# Altium footprint library RPSLib_Connectors.PcbLib: 85 footprints (part 5 of 6)
Each footprint in its own frame and in the unit in brackets; x right, y up, seen from the top. Pads: shape width x height; smd on the part's side, far side on the other; paste and mask are expansions set on the pad; w line width, h text height; cw(c..) or ccw(c..) is an arc to the next point about the centre after c.
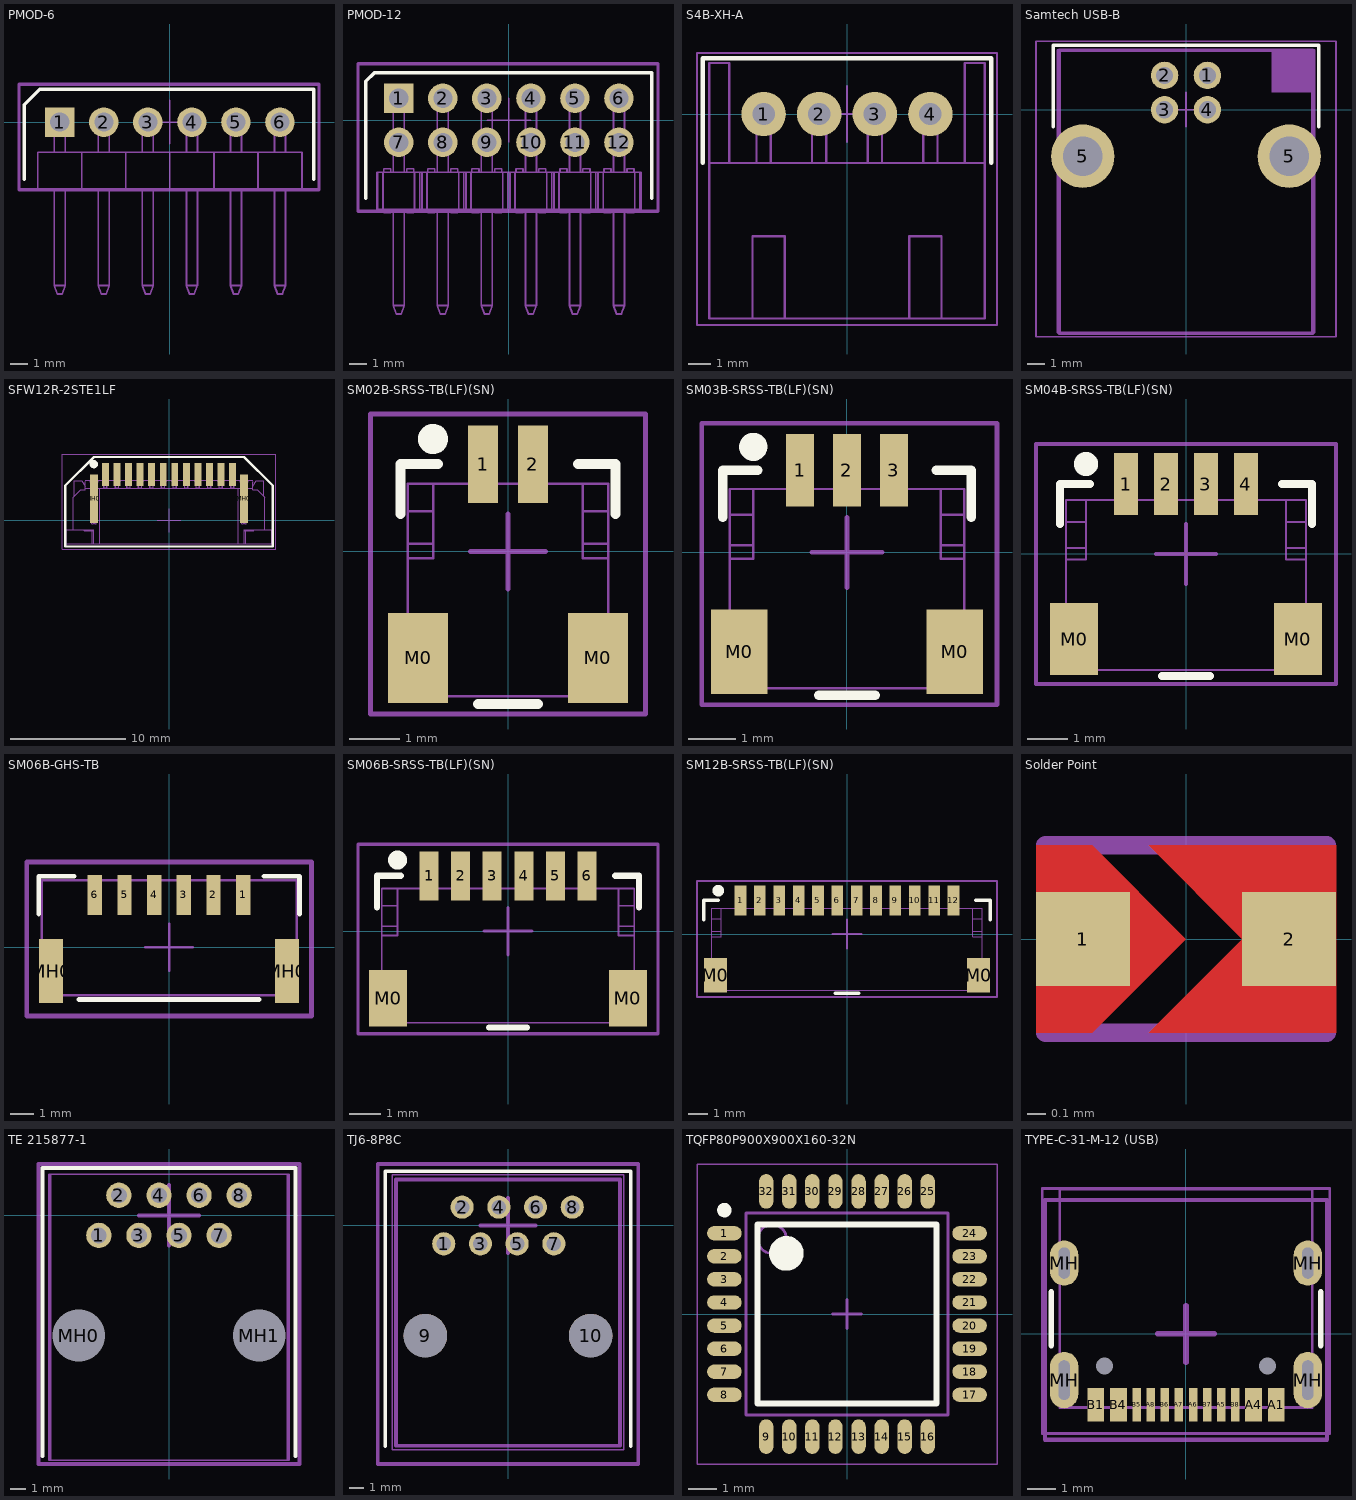
[diagram p4: the footprints below, top view; thin cyan lines are the x and y axes]

## PMOD-6 [mm] "Digilent PMOD connector 6 pin"
height 2.5
pads (6):
  rect 1.7x1.7 hole 1.1 mask+0.07: 1(-6.35,0)
  round 1.7 hole 1.1 mask+0.07: 2(-3.81,0) 3(-1.27,0) 4(1.27,0) 5(3.81,0) 6(6.35,0)
Top Overlay:
  lines w0.2: -8.4,-3.3 -8.4,1 -7.5,1.9 8.3,1.9 8.3,-3.3
Top Designator:
  text ".Designator" at -2.868,-0.271 h1.2
Top Courtyard:
  lines w0.1: -1.25,0 1.25,0 ; 0,-1.25 0,1.25
  lines w0.2: -8.7,-3.9 8.6,-3.9 8.6,2.2 -8.7,2.2 -8.7,-3.9
Top 3D Body:
  lines w0.1: -6.667,-3.861 -6.667,-9.417 ; -6.667,-1.727 -6.667,-0.953 -6.667,0.318 -6.032,0.318 -6.032,-0.953 -6.032,-1.727 ; -6.032,-3.861 -6.032,-9.417 ; -4.127,-3.861 -4.127,-9.417 ; -4.127,-1.727 -4.127,-0.953 -4.127,0.318 -3.492,0.318 -3.492,-0.953 -3.492,-1.727 ; -3.492,-3.861 -3.492,-9.417 ; -1.587,-3.861 -1.587,-9.417 ; -1.587,-1.727 -1.587,-0.953 -1.587,0.318 -0.953,0.318 -0.953,-0.953 -0.953,-1.727 ; -0.953,-3.861 -0.953,-9.417 ; 0.953,-3.861 0.953,-9.417 ; 0.953,-1.727 0.953,-0.953 0.953,0.318 1.587,0.318 1.587,-0.953 1.587,-1.727 ; 1.587,-3.861 1.587,-9.417 ; 3.492,-3.861 3.492,-9.417 ; 3.492,-1.727 3.492,-0.953 3.492,0.318 4.127,0.318 4.127,-0.953 4.127,-1.727 ; 4.127,-3.861 4.127,-9.417 ; 6.032,-3.861 6.032,-9.417 ; 6.032,-1.727 6.032,-0.953 6.032,0.318 6.667,0.318 6.667,-0.953 6.667,-1.727 ; 6.667,-3.861 6.667,-9.417 ; -6.667,-9.417 -6.032,-9.417 ; -6.667,-9.417 -6.49,-9.906 -6.21,-9.906 -6.032,-9.417 ; -5.08,-3.861 -5.08,-1.727 ; -5.08,-3.861 -4.775,-3.861 -2.845,-3.861 -2.54,-3.861 ; -5.08,-3.861 -5.385,-3.861 -7.315,-3.861 -7.62,-3.861 -7.62,-1.727 -7.315,-1.727 -5.385,-1.727 -5.08,-1.727 ; -5.08,-1.727 -4.775,-1.727 -2.845,-1.727 -2.54,-1.727 ; -4.127,-9.417 -3.95,-9.906 -3.67,-9.906 -3.492,-9.417 ; -4.127,-9.417 -3.492,-9.417 ; -2.54,-3.861 -2.54,-1.727 ; -2.54,-3.861 -2.235,-3.861 -0.305,-3.861 0,-3.861 ; -2.54,-1.727 -2.235,-1.727 -0.305,-1.727 0,-1.727 ; -1.587,-9.417 -0.953,-9.417 ; -1.587,-9.417 -1.41,-9.906 -1.13,-9.906 -0.953,-9.417 ; 0,-3.861 0,-1.727 ; 0,-3.861 0.305,-3.861 2.235,-3.861 2.54,-3.861 ; 0,-1.727 0.305,-1.727 2.235,-1.727 2.54,-1.727 ; 0.953,-9.417 1.587,-9.417 ; 0.953,-9.417 1.13,-9.906 1.41,-9.906 1.587,-9.417 ; 2.54,-3.861 2.54,-1.727 ; 2.54,-3.861 2.845,-3.861 4.775,-3.861 5.08,-3.861 ; 2.54,-1.727 2.845,-1.727 4.775,-1.727 5.08,-1.727 ; 3.492,-9.417 4.127,-9.417 ; 3.492,-9.417 3.67,-9.906 3.95,-9.906 4.127,-9.417 ; 5.08,-3.861 5.08,-1.727 ; 5.08,-3.861 5.385,-3.861 7.315,-3.861 7.62,-3.861 7.62,-1.727 7.315,-1.727 5.385,-1.727 5.08,-1.727 ; 6.032,-9.417 6.21,-9.906 6.49,-9.906 6.667,-9.417 ; 6.032,-9.417 6.667,-9.417
3D body "PMOD-6pin.stp": height 2.41, standoff -2.98, extent -7.62,-9.906 7.62,0.318

## PMOD-12 [mm] "Digilent PMOD connector 12 pin"
height 4.9
pads (12):
  rect 1.7x1.7 hole 1.1 mask+0.07: 1(-6.35,1.27)
  round 1.7 hole 1.1 mask+0.07: 2(-3.81,1.27) 3(-1.27,1.27) 4(1.27,1.27) 5(3.81,1.27) 6(6.35,1.27) 7(-6.35,-1.27) 8(-3.81,-1.27) 9(-1.27,-1.27) 10(1.27,-1.27) 11(3.81,-1.27) 12(6.35,-1.27)
Top Overlay:
  lines w0.2: -8.25,-4.5 -8.25,2.25 -7.75,2.75 8.25,2.75 8.25,-4.5
Top Designator:
  text ".Designator" at -2.868,-0.271 h1.2
Top Courtyard:
  lines w0.1: -1.25,0 1.25,0 ; 0,-1.25 0,1.25
  lines w0.2: -8.7,-5.25 8.6,-5.25 8.6,3.25 -8.7,3.25 -8.7,-5.25
Top 3D Body:
  drawing of 256 lines, arcs and shapes, not listed
3D body "PMOD-12pin.stp": height 4.83, standoff -3.06, extent -7.62,-11.176 7.62,1.588

## S4B-XH-A [mm]
pads (4):
  round 2 hole 1 mask+0.07: 1(-3.75,0) 2(-1.25,0) 3(1.25,0) 4(3.75,0)
Top Overlay:
  lines w0.2: -6.5,-2.2 -6.5,2.5 6.5,2.5 6.5,-2.2
Top Designator:
  text ".Designator" at -2.868,-0.271 h1.2
Top Courtyard:
  lines w0.1: -1.25,0 1.25,0 ; 0,-1.25 0,1.25 ; -6.75,-9.5 -6.75,2.75 6.75,2.75 6.75,-9.5 -6.75,-9.5
Top 3D Body:
  lines w0.1: -5.3,-2.2 -5.3,2.3 -6.2,2.3 -6.2,-2.2 ; -4.07,-2.2 -4.07,-0.92 -4.07,0.32 -3.43,0.32 -3.43,-0.92 -3.43,-2.2 ; -1.57,-2.2 -1.57,-0.92 -1.57,0.32 -0.93,0.32 -0.93,-0.92 -0.93,-2.2 ; 0.93,-2.2 0.93,-0.92 0.93,0.32 1.57,0.32 1.57,-0.92 1.57,-2.2 ; 3.43,-2.2 3.43,-0.92 3.43,0.32 4.07,0.32 4.07,-0.92 4.07,-2.2 ; 5.3,-2.2 5.3,2.3 6.2,2.3 6.2,-2.2 ; -6.2,-2.2 6.2,-2.2 ; -6.2,-2.2 -6.2,-9.2 -4.25,-9.2 ; -4.25,-9.2 -2.8,-9.2 ; -4.25,-9.2 -4.25,-5.5 -2.8,-5.5 -2.8,-9.2 ; -2.8,-9.2 2.8,-9.2 ; 2.8,-9.2 4.25,-9.2 ; 2.8,-9.2 2.8,-5.5 4.25,-5.5 4.25,-9.2 ; 4.25,-9.2 6.2,-9.2 6.2,-2.2
3D body "S4B-XH-A_norm.stp": height 6.15, standoff -3.4, extent -6.2,-9.2 6.2,2.3

## Samtech USB-B [mm]
pads (6):
  round 1.6 hole 1: 1(1.25,2) 2(-1.25,2) 3(-1.25,0) 4(1.25,0)
  round 3.7 hole 2.3: 5(-6.02,-2.71) 5(6.02,-2.71)
Top Overlay:
  lines w0.2: -7.75,-1 -7.75,3.75 7.75,3.75 7.75,-1
Top Designator:
  rectangle: 5,1 7.5,3.5
  lines w0.1: -7.5,-13 -7.5,3.5 7.5,3.5 7.5,-13 -7.5,-13
  text ".Designator" at -2.868,-0.271 h1.2
Top Courtyard:
  lines w0.1: -1,0 1,0 ; 0,-1 0,1 ; -8.75,-13.25 -8.75,4 8.75,4 8.75,-13.25 -8.75,-13.25
Top 3D Body:
  lines w0.2: -7.4,-13.03 -7.4,3.47 7.398,3.47 7.398,-13.03 -7.4,-13.03
20:
  text ".Designator" at -1.126,-0.113 h0.5
3D body "USB-B.stp": height 11.2, standoff -3.44, extent -7.4,-13.03 7.398,3.47

## SFW12R-2STE1LF [mm]
height 2.7
pads (14):
  rect 0.6x2 smd mask+0.07: 1(-5.5,4) 2(-4.5,4) 3(-3.5,4) 4(-2.5,4) 5(-1.5,4) 6(-0.5,4) 7(0.5,4) 8(1.5,4) 9(2.5,4) 10(3.5,4) 11(4.5,4) 12(5.5,4)
  rect 0.7x4.2 smd mask+0.07: MH0(-6.5,1.9) MH0(6.5,1.9)
Top Overlay:
  circle w0.35: c-6.518,4.88 r0.18
  lines w0.2: -9,-2.25 9,-2.25 9,3 6.5,5.5 -6.5,5.5 -9,3 -9,-2.25
Top Designator:
  text ".Designator" at -2.868,-0.271 h1.2
Top Courtyard:
  lines w0.1: -1,0 1,0 ; 0,-1 0,1 ; -9.25,-2.5 -9.25,5.75 9.25,5.75 9.25,-2.5 -9.25,-2.5
Top 3D Body:
  drawing of 1279 lines, arcs and shapes, not listed
3D body "SFW12R-2STE1LF_norm.stp": height 2.7, standoff 0, extent -8.9,-2 8.9,4.5

## SM02B-SRSS-TB(LF)(SN) [mm] "JST 1.0 mm pitch connector"
height 3
pads (4):
  rect 0.6x1.55 smd mask+0.07: 1(-0.5,1.75) 2(0.5,1.75)
  rect 1.2x1.8 smd mask+0.07: M0(-1.8,-2.125) M0(1.8,-2.125)
Top Overlay:
  circle w0.4: c-1.5,2.25 r0.1
  lines w0.2: -2.15,0.75 -2.15,1.75 -1.4,1.75 ; -0.6,-3.05 0.6,-3.05 ; 1.4,1.75 2.15,1.75 2.15,0.75
Top Designator:
  text ".Designator" at -2.868,-0.271 h1.2
Top Courtyard:
  lines w0.1: -0.75,0 0.75,0 ; 0,-0.75 0,0.75 ; -2.75,-3.25 -2.75,2.75 2.75,2.75 2.75,-3.25 -2.75,-3.25
Top 3D Body:
  lines w0.05: -1.5,0.15 -2,0.15 ; -1.5,0.8 -2,0.8 ; -0.6,1.35 -0.6,2.05 -0.4,2.05 -0.4,1.35 ; 0.4,1.35 0.4,2.05 0.6,2.05 0.6,1.35 ; 1.5,0.15 2,0.15 ; 1.5,0.8 2,0.8 ; -2,-0.139 -1.5,-0.139 -1.5,1.35 ; -2,-0.139 -2,0.15 ; -2,-0.139 -2,-2.9 2,-2.9 2,-0.139 ; -2,0.15 -2,0.8 ; -2,0.8 -2,1.35 -1.5,1.35 ; -1.5,1.35 1.5,1.35 ; 1.5,1.35 2,1.35 2,0.8 ; 1.5,1.35 1.5,-0.139 2,-0.139 ; 2,-0.139 2,0.15 ; 2,0.15 2,0.8
3D body "SM02B-SRSS-TB.STEP": height 2.96, standoff 0, extent -2,-2.895 2,2.055

## SM03B-SRSS-TB(LF)(SN) [mm] "JST 1.0 mm pitch connector"
height 3
pads (5):
  rect 0.6x1.55 smd mask+0.07: 1(-1,1.75) 2(0,1.75) 3(1,1.75)
  rect 1.2x1.8 smd mask+0.07: M0(-2.3,-2.125) M0(2.3,-2.125)
Top Overlay:
  circle w0.4: c-2,2.25 r0.1
  lines w0.2: -2.65,0.75 -2.65,1.75 -1.9,1.75 ; -0.6,-3.05 0.6,-3.05 ; 1.9,1.75 2.65,1.75 2.65,0.75
Top Designator:
  text ".Designator" at -2.868,-0.271 h1.2
Top Courtyard:
  lines w0.1: -0.75,0 0.75,0 ; 0,-0.75 0,0.75 ; -3.1,-3.25 3.2,-3.25 3.2,2.75 -3.1,2.75 -3.1,-3.25
Top 3D Body:
  lines w0.05: -2,0.15 -2.5,0.15 ; -2,0.8 -2.5,0.8 ; -1.1,1.35 -1.1,2.05 -0.9,2.05 -0.9,1.35 ; -0.1,1.35 -0.1,2.05 0.1,2.05 0.1,1.35 ; 0.9,1.35 0.9,2.05 1.1,2.05 1.1,1.35 ; 2,0.15 2.5,0.15 ; 2,0.8 2.5,0.8 ; -2.5,-0.139 -2.5,0.15 ; -2.5,-0.139 -2.5,-2.9 2.5,-2.9 2.5,-0.139 ; -2.5,-0.139 -2,-0.139 -2,1.35 ; -2.5,0.15 -2.5,0.8 ; -2.5,0.8 -2.5,1.35 -2,1.35 ; -2,1.35 2,1.35 ; 2,1.35 2,-0.139 2.5,-0.139 ; 2,1.35 2.5,1.35 2.5,0.8 ; 2.5,-0.139 2.5,0.15 ; 2.5,0.15 2.5,0.8
3D body "SM03B-SRSS-TB.STEP": height 2.96, standoff 0, extent -2.5,-2.895 2.5,2.055

## SM04B-SRSS-TB(LF)(SN) [mm] "JST 1.0 mm pitch connector"
height 3
pads (6):
  rect 0.6x1.55 smd mask+0.07: 1(-1.5,1.75) 2(-0.5,1.75) 3(0.5,1.75) 4(1.5,1.75)
  rect 1.2x1.8 smd mask+0.07: M0(-2.8,-2.125) M0(2.8,-2.125)
Top Overlay:
  circle w0.4: c-2.5,2.25 r0.1
  lines w0.2: -3.15,0.75 -3.15,1.75 -2.4,1.75 ; -0.6,-3.05 0.6,-3.05 ; 2.4,1.75 3.15,1.75 3.15,0.75
Top Designator:
  text ".Designator" at -2.868,-0.271 h1.2
Top Courtyard:
  lines w0.1: -0.75,0 0.75,0 ; 0,-0.75 0,0.75 ; -3.75,-3.25 3.75,-3.25 3.75,2.75 -3.75,2.75 -3.75,-3.25
Top 3D Body:
  lines w0.05: -2.5,0.15 -3,0.15 ; -2.5,0.8 -3,0.8 ; -1.6,1.35 -1.6,2.05 -1.4,2.05 -1.4,1.35 ; -0.6,1.35 -0.6,2.05 -0.4,2.05 -0.4,1.35 ; 0.4,1.35 0.4,2.05 0.6,2.05 0.6,1.35 ; 1.4,1.35 1.4,2.05 1.6,2.05 1.6,1.35 ; 2.5,0.15 3,0.15 ; 2.5,0.8 3,0.8 ; -3,-0.139 -2.5,-0.139 -2.5,1.35 ; -3,-0.139 -3,0.15 ; -3,-0.139 -3,-2.9 3,-2.9 3,-0.139 ; -3,0.15 -3,0.8 ; -3,0.8 -3,1.35 -2.5,1.35 ; -2.5,1.35 2.5,1.35 ; 2.5,1.35 3,1.35 3,0.8 ; 2.5,1.35 2.5,-0.139 3,-0.139 ; 3,-0.139 3,0.15 ; 3,0.15 3,0.8
3D body "SM04B-SRSS-TB.STEP": height 2.96, standoff 0, extent -3,-2.895 3,2.055

## SM06B-GHS-TB [mm]
height 4.5
pads (8):
  rect 0.6x1.7 smd mask+0.07: 1(3.12,2.208) 2(1.87,2.208) 3(0.62,2.208) 4(-0.63,2.208) 5(-1.88,2.208) 6(-3.13,2.208)
  rect 1x2.7 smd mask+0.07: MH0(-4.978,-1) MH0(4.967,-1)
Top Overlay:
  lines w0.2: -5.5,1.4 -5.5,3 -4,3 ; -3.8,-2.2 3.8,-2.2 ; 4,3 5.5,3 5.5,1.4
Top Designator:
  text ".Designator" at -2.868,-0.271 h1.2
Top Courtyard:
  lines w0.1: -1,0 1,0 ; 0,-1 0,1
  lines w0.2: -6,-2.9 -6,3.6 6,3.6 6,-2.9 -6,-2.9
Top 3D Body:
  lines w0.1: -5.375,-2.025 -5.375,2.825 5.375,2.825 5.375,-2.025 -5.375,-2.025
3D body "SM06B-GHS-TB_norm.stp": height 4.35, standoff 0, extent -5.375,-2.025 5.375,2.825

## SM06B-SRSS-TB(LF)(SN) [mm] "JST 1.0 mm pitch connector"
height 3
pads (8):
  rect 0.6x1.55 smd mask+0.07: 1(-2.5,1.75) 2(-1.5,1.75) 3(-0.5,1.75) 4(0.5,1.75) 5(1.5,1.75) 6(2.5,1.75)
  rect 1.2x1.8 smd mask+0.07: M0(-3.8,-2.125) M0(3.8,-2.125)
Top Overlay:
  circle w0.4: c-3.5,2.25 r0.1
  lines w0.2: -4.15,0.75 -4.15,1.75 -3.4,1.75 ; -0.6,-3.05 0.6,-3.05 ; 3.4,1.75 4.15,1.75 4.15,0.75
Top Designator:
  text ".Designator" at -2.868,-0.271 h1.2
Top Courtyard:
  lines w0.1: -0.75,0 0.75,0 ; 0,-0.75 0,0.75 ; -4.75,-3.25 4.75,-3.25 4.75,2.75 -4.75,2.75 -4.75,-3.25
Top 3D Body:
  lines w0.05: -3.5,0.15 -4,0.15 ; -3.5,0.8 -4,0.8 ; -2.6,1.35 -2.6,2.05 -2.4,2.05 -2.4,1.35 ; -1.6,1.35 -1.6,2.05 -1.4,2.05 -1.4,1.35 ; -0.6,1.35 -0.6,2.05 -0.4,2.05 -0.4,1.35 ; 0.4,1.35 0.4,2.05 0.6,2.05 0.6,1.35 ; 1.4,1.35 1.4,2.05 1.6,2.05 1.6,1.35 ; 2.4,1.35 2.4,2.05 2.6,2.05 2.6,1.35 ; 3.5,0.15 4,0.15 ; 3.5,0.8 4,0.8 ; -4,-0.139 -3.5,-0.139 -3.5,1.35 ; -4,-0.139 -4,0.15 ; -4,-0.139 -4,-2.9 4,-2.9 4,-0.139 ; -4,0.15 -4,0.8 ; -4,0.8 -4,1.35 -3.5,1.35 ; -3.5,1.35 3.5,1.35 ; 3.5,1.35 4,1.35 4,0.8 ; 3.5,1.35 3.5,-0.139 4,-0.139 ; 4,-0.139 4,0.15 ; 4,0.15 4,0.8
3D body "SM06B-SRSS-TB.STEP": height 2.96, standoff 0, extent -4,-2.895 4,2.055

## SM12B-SRSS-TB(LF)(SN) [mm] "JST 1.0 mm pitch connector"
height 3
pads (14):
  rect 0.6x1.55 smd mask+0.07: 1(-5.5,1.75) 2(-4.5,1.75) 3(-3.5,1.75) 4(-2.5,1.75) 5(-1.5,1.75) 6(-0.5,1.75) 7(0.5,1.75) 8(1.5,1.75) 9(2.5,1.75) 10(3.5,1.75) 11(4.5,1.75) 12(5.5,1.75)
  rect 1.2x1.8 smd mask+0.07: M0(-6.8,-2.125) M0(6.8,-2.125)
Top Overlay:
  circle w0.4: c-6.65,2.25 r0.1
  lines w0.2: -7.4,0.75 -7.4,1.75 -6.65,1.75 ; -0.6,-3.05 0.6,-3.05 ; 6.65,1.75 7.4,1.75 7.4,0.75
Top Designator:
  text ".Designator" at -2.868,-0.271 h1.2
Top Courtyard:
  lines w0.1: -0.75,0 0.75,0 ; 0,-0.75 0,0.75 ; -7.75,-3.25 7.75,-3.25 7.75,2.75 -7.75,2.75 -7.75,-3.25
Top 3D Body:
  lines w0.05: -6.5,0.15 -7,0.15 ; -6.5,0.8 -7,0.8 ; -5.6,1.35 -5.6,2.05 -5.4,2.05 -5.4,1.35 ; -4.6,1.35 -4.6,2.05 -4.4,2.05 -4.4,1.35 ; -3.6,1.35 -3.6,2.05 -3.4,2.05 -3.4,1.35 ; -2.6,1.35 -2.6,2.05 -2.4,2.05 -2.4,1.35 ; -1.6,1.35 -1.6,2.05 -1.4,2.05 -1.4,1.35 ; -0.6,1.35 -0.6,2.05 -0.4,2.05 -0.4,1.35 ; 0.4,1.35 0.4,2.05 0.6,2.05 0.6,1.35 ; 1.4,1.35 1.4,2.05 1.6,2.05 1.6,1.35 ; 2.4,1.35 2.4,2.05 2.6,2.05 2.6,1.35 ; 3.4,1.35 3.4,2.05 3.6,2.05 3.6,1.35 ; 4.4,1.35 4.4,2.05 4.6,2.05 4.6,1.35 ; 5.4,1.35 5.4,2.05 5.6,2.05 5.6,1.35 ; 6.5,0.15 7,0.15 ; 6.5,0.8 7,0.8 ; -7,-0.139 -7,0.15 ; -7,-0.139 -6.5,-0.139 -6.5,1.35 ; -7,-0.139 -7,-2.9 7,-2.9 7,-0.139 ; -7,0.15 -7,0.8 ; -7,0.8 -7,1.35 -6.5,1.35 ; -6.5,1.35 6.5,1.35 ; 6.5,1.35 7,1.35 7,0.8 ; 6.5,1.35 6.5,-0.139 7,-0.139 ; 7,-0.139 7,0.15 ; 7,0.15 7,0.8
3D body "SM12B-SRSS-TB.STEP": height 2.96, standoff 0, extent -7,-2.895 7,2.055

## Solder Point [mm] "Перемычка паямая"
pads (2):
  rect 0.5x0.5 smd mask+0.102: 1(-0.55,0)
  rect 0.5x0.5 smd mask+0.07: 2(0.55,0)
Top Layer:
  region: 0,0 -0.5,-0.5 -0.8,-0.5 -0.8,0.5 -0.5,0.5
  region: -0.2,-0.5 0.3,0 0.8,0 0.8,-0.5
  region: -0.2,0.5 0.3,0 0.8,0 0.8,0.5
Top Solder:
  rectangle: -0.55,-0.5 0.5,0.5
Top Designator:
  lines w0.1: -0.75,-0.5 0.75,-0.5 0.75,0.5 -0.75,0.5 -0.75,-0.5
  text ".Designator" at -2.868,-0.271 h1.2
20:
  text ".Designator" at -1.126,-0.113 h0.5

## TE 215877-1 [mm] "Alcoswitch SE, RJ45 Connectors,"
height 12
pads (10):
  round 1.6 hole 1: 1(-4.445,-1.27) 2(-3.175,1.27) 3(-1.905,-1.27) 4(-0.635,1.27) 5(0.635,-1.27) 6(1.905,1.27) 7(3.175,-1.27) 8(4.445,1.27)
  round 3 hole 3.3 unplated: MH0(-5.715,-7.62) MH1(5.715,-7.62)
Top Overlay:
  lines w0.254: -8,-15.25 -8,3 8,3 8,-15.25
Top Designator:
  lines w0.1: -7.5,-15.5 7.5,-15.5 7.5,2.6 -7.5,2.6 -7.5,-15.5
  text ".Designator" at -2.868,-0.271 h1.2
Top Courtyard:
  lines w0.254: -1.905,0 1.905,0 ; 0,-1.905 0,1.905 ; -8.25,-15.75 -8.25,3.25 8.25,3.25 8.25,-15.75 -8.25,-15.75
Top 3D Body:
  lines w0.1: -7.6,-15.5 -7.6,2.6 7.6,2.6 7.6,-15.5 -7.6,-15.5
20:
  text ".Designator" at -2.253,-0.226 h1
3D body "c-215877-1-p-3d.stp": height 11.75, standoff -2.95, extent -7.6,-15.5 7.6,2.6

## TJ6-8P8C [mm]
height 12
pads (10):
  round 1.6 hole 1: 1(-4.445,-1.27) 2(-3.175,1.27) 3(-1.905,-1.27) 4(-0.635,1.27) 5(0.635,-1.27) 6(1.905,1.27) 7(3.175,-1.27) 8(4.445,1.27)
  round 3 hole 3 unplated: 9(-5.715,-7.62) 10(5.715,-7.62)
Top Overlay:
  lines w0.254: -8.5,-15.25 -8.5,3.75 8.5,3.75 8.5,-15.25
Top Designator:
  lines w0.1: -8,-15.5 -8,3.5 8,3.5 8,-15.5 -8,-15.5
  text ".Designator" at -2.868,-0.271 h1.2
Top Courtyard:
  lines w0.254: -1.905,0 1.905,0 ; 0,-1.905 0,1.905 ; -9,-16.5 9,-16.5 9,4.25 -9,4.25 -9,-16.5
Top 3D Body:
  lines w0.25: -7.747,-15.24 7.747,-15.24 7.747,3.175 -7.747,3.175 -7.747,-15.24
20:
  text ".Designator" at -2.253,-0.226 h1
3D body: height 12, standoff 0.1, extent -7.747,-15.24 7.747,3.175

## TQFP80P900X900X160-32N [mm] "TQFP, 32-Leads, Body 7,00x7,00mm, Pitch 0,80mm, IPC Medium Density"
height 1.6
pads (32):
  oval 1.2x0.5 smd: 1(-4.25,2.8) 2(-4.25,2) 3(-4.25,1.2) 4(-4.25,0.4) 5(-4.25,-0.4) 6(-4.25,-1.2) 7(-4.25,-2) 8(-4.25,-2.8) 17(4.25,-2.8) 18(4.25,-2) 19(4.25,-1.2) 20(4.25,-0.4) 21(4.25,0.4) 22(4.25,1.2) 23(4.25,2) 24(4.25,2.8)
  oval 0.5x1.2 smd: 9(-2.8,-4.25) 10(-2,-4.25) 11(-1.2,-4.25) 12(-0.4,-4.25) 13(0.4,-4.25) 14(1.2,-4.25) 15(2,-4.25) 16(2.8,-4.25) 25(2.8,4.25) 26(2,4.25) 27(1.2,4.25) 28(0.4,4.25) 29(-0.4,4.25) 30(-1.2,4.25) 31(-2,4.25) 32(-2.8,4.25)
Top Overlay:
  circle w0.6: c-2.1,2.1 r0.3
  circle w0.25: c-4.25,3.6 r0.125
  lines w0.2: -3.1,-3.1 3.1,-3.1 3.1,3.1 -3.1,3.1 -3.1,-3.1
Top Courtyard:
  lines w0.05: -5.2,-5.2 5.2,-5.2 5.2,5.2 -5.2,5.2 -5.2,-5.2
  lines w0.1: -0.5,0 0.5,0 ; 0,-0.5 0,0.5
Top Assembly:
  circle w0.1: c-2.6,2.6 r0.5
  lines w0.1: -3.5,-3.5 3.5,-3.5 3.5,3.5 -3.5,3.5 -3.5,-3.5
3D body "TQFP80P900X900X160-32N.step": height 1.6, standoff 0, extent -4.5,-4.5 4.5,4.5

## TYPE-C-31-M-12 (USB) [mm]
pads (18):
  rect 0.6x1.2 smd mask+0.05: A1(3.2,-2.512) A4(2.4,-2.512) B1(-3.2,-2.512) B4(-2.4,-2.512)
  rect 0.3x1.2 smd mask+0.05: A5(1.25,-2.512) A6(0.25,-2.512) A7(-0.25,-2.512) A8(-1.25,-2.512) B5(-1.75,-2.512) B6(-0.75,-2.512) B7(0.75,-2.512) B8(1.75,-2.512)
  oval 1x2 hole 0.4 slot 1.4 at 90 deg paste+0 mask+0.075: MH(-4.32,-1.637) MH(4.32,-1.637)
  oval 1x1.6 hole 0.4 slot 1.1 at 90 deg paste+0 mask+0.075: MH(-4.32,2.513) MH(4.32,2.513)
  round 0 hole 0.6 mask+0.075: MH0(-2.89,-1.137) MH0(2.89,-1.137)
Top Overlay:
  lines w0.2: -4.775,-0.412 -4.775,1.488 ; 4.775,-0.412 4.775,1.488
Top Courtyard:
  lines w0.1: -5.1,-3.537 5.1,-3.537 5.1,5.163 -5.1,5.163 -5.1,-3.537
  lines w0.2: -1,0 1,0 ; 0,-1 0,1
Bottom 3D Body:
  lines w0.1: -0.5,0.013 0.5,0.013 ; 0,-0.487 0,0.513
Top Assembly:
  lines w0.15: -5,-3.75 5,-3.75 5,4.75 -5,4.75 -5,-3.75
  text ".Designator" at -2.868,-0.271 h1.2
M11:
  lines w0.1: -4.475,-2.612 -4.475,5.138 4.475,5.138 4.475,-2.612 -4.475,-2.612
20:
  text ".Designator" at -1.126,-0.113 h0.5
3D body "User Library-USB - C.STEP": height 3.26, standoff -1, extent -4.475,-2.612 4.475,5.137